# Altium footprint library microbuilder.PCBLIB: 422 footprints (part 20 of 27)
Each footprint in its own frame and in the unit in brackets; x right, y up, seen from the top. Pads: shape width x height; smd on the part's side, far side on the other; paste and mask are expansions set on the pad; w line width, h text height; cw(c..) or ccw(c..) is an arc to the next point about the centre after c.
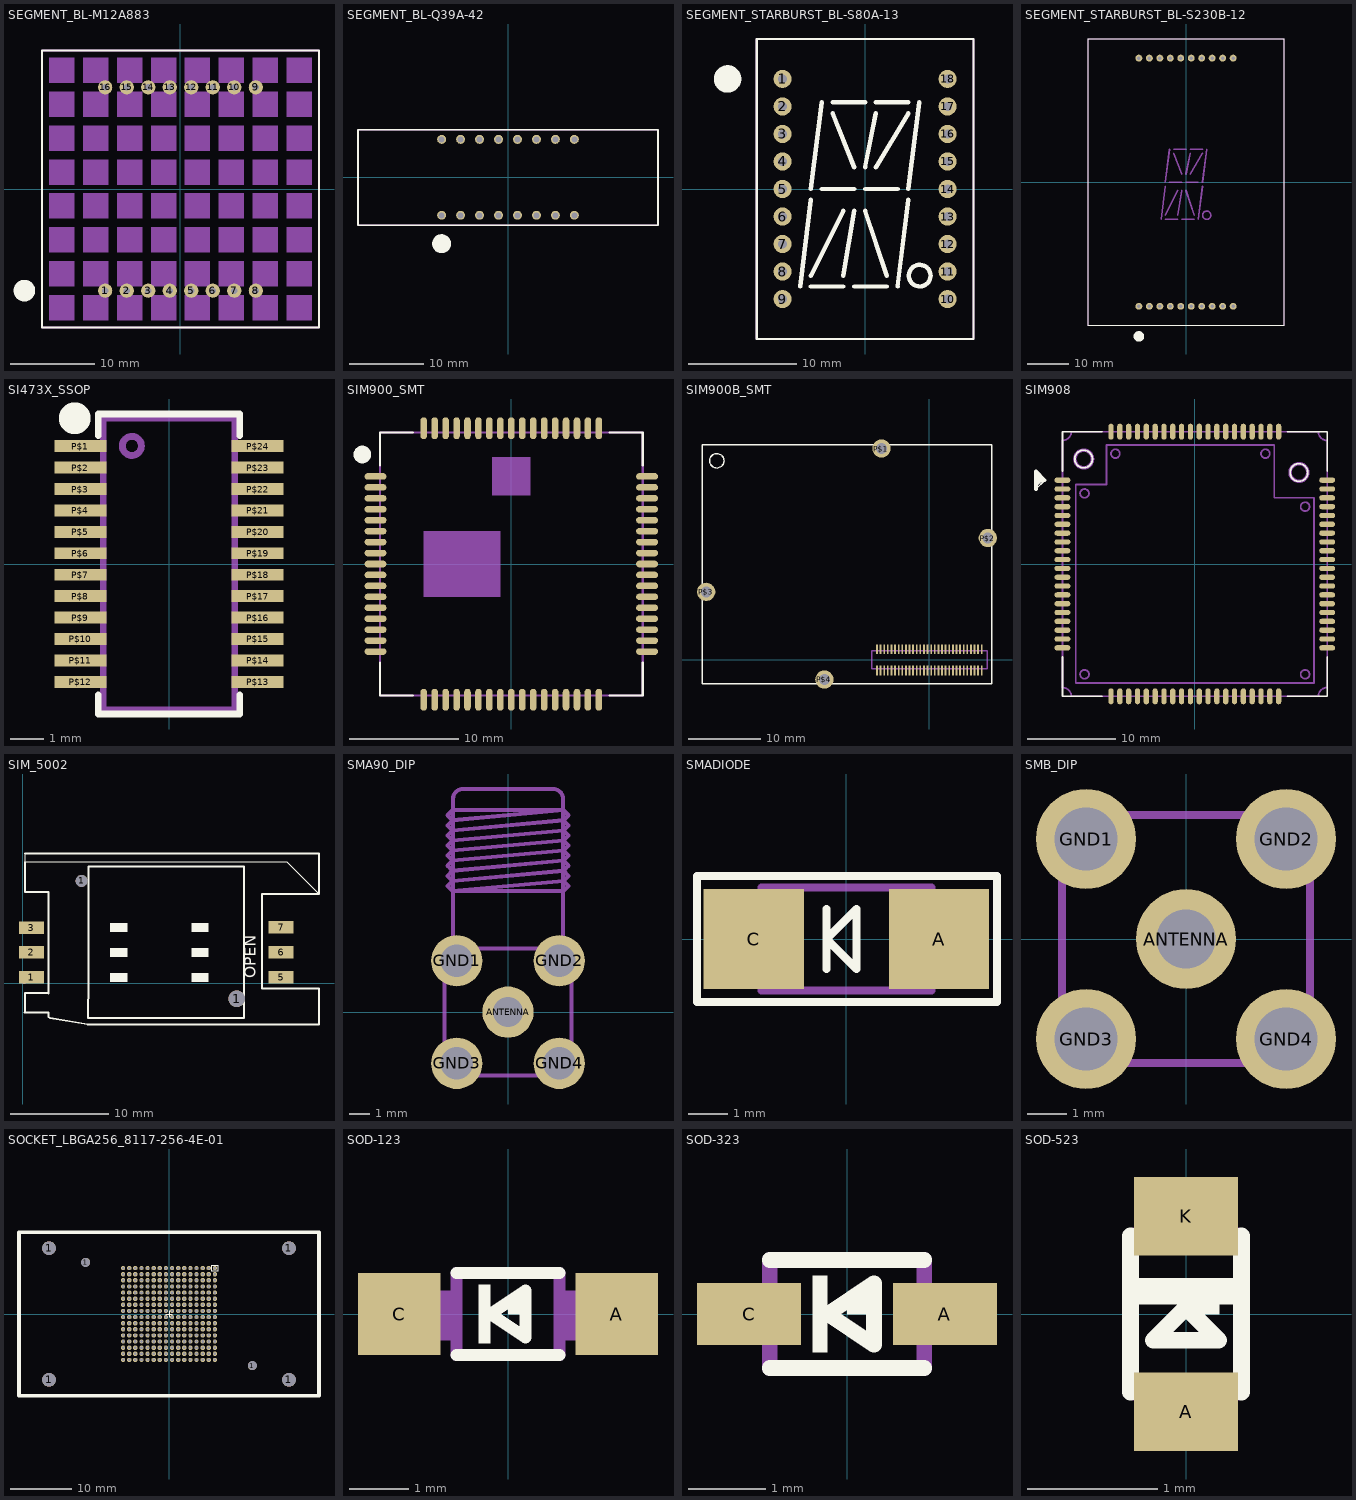
[diagram p19: the footprints below, top view; thin cyan lines are the x and y axes]

## SEGMENT_BL-M12A883 [mil]
pads (16):
  round 66 hole 31.5: 1(-350,-472.44) 2(-250,-472.44) 3(-150,-472.44) 4(-50,-472.44) 5(50,-472.44) 6(150,-472.44) 7(250,-472.44) 8(350,-472.44) 9(350,472.44) 10(250,472.44) 11(150,472.44) 12(50,472.44) 13(-50,472.44) 14(-150,472.44) 15(-250,472.44) 16(-350,472.44)
Top Overlay:
  circle w50: c-725.59,-472.44 r25
  lines w8: -643.7,-643.7 643.7,-643.7 643.7,643.7 -643.7,643.7 -643.7,-643.7
Mechanical 16:
  rectangle: -610.24,492.13 -492.13,610.24
  rectangle: -452.76,492.13 -334.65,610.24
  rectangle: -295.28,492.13 -177.17,610.24
  rectangle: -137.8,492.13 -19.69,610.24
  rectangle: 19.69,492.13 137.8,610.24
  rectangle: 177.17,492.13 295.28,610.24
  rectangle: 334.65,492.13 452.76,610.24
  rectangle: 492.13,492.13 610.24,610.24
  rectangle: 492.13,334.65 610.24,452.76
  rectangle: 334.65,334.65 452.76,452.76
  rectangle: 177.17,334.65 295.28,452.76
  rectangle: 19.69,334.65 137.8,452.76
  rectangle: -137.8,334.65 -19.69,452.76
  rectangle: -295.28,334.65 -177.17,452.76
  rectangle: -610.24,334.65 -492.13,452.76
  rectangle: -452.76,334.65 -334.65,452.76
  rectangle: -610.24,177.17 -492.13,295.28
  rectangle: -452.76,177.17 -334.65,295.28
  rectangle: -295.28,177.17 -177.17,295.28
  rectangle: -137.8,177.17 -19.69,295.28
  rectangle: 19.69,177.17 137.8,295.28
  rectangle: 177.17,177.17 295.28,295.28
  rectangle: 334.65,177.17 452.76,295.28
  rectangle: 492.13,177.17 610.24,295.28
  rectangle: 492.13,19.69 610.24,137.8
  rectangle: 492.13,-137.8 610.24,-19.69
  rectangle: 334.65,-137.8 452.76,-19.69
  rectangle: 334.65,19.69 452.76,137.8
  rectangle: 177.17,19.69 295.28,137.8
  rectangle: 19.69,19.69 137.8,137.8
  rectangle: -137.8,19.69 -19.69,137.8
  rectangle: -295.28,19.69 -177.17,137.8
  rectangle: -452.76,19.69 -334.65,137.8
  rectangle: -610.24,19.69 -492.13,137.8
  rectangle: -610.24,-137.8 -492.13,-19.69
  rectangle: -452.76,-137.8 -334.65,-19.69
  rectangle: -295.28,-137.8 -177.17,-19.69
  rectangle: -137.8,-137.8 -19.69,-19.69
  rectangle: 19.69,-137.8 137.8,-19.69
  rectangle: 177.17,-137.8 295.28,-19.69
  rectangle: 492.13,-295.28 610.24,-177.17
  rectangle: 334.65,-295.28 452.76,-177.17
  rectangle: -610.24,-295.28 -492.13,-177.17
  rectangle: -452.76,-295.28 -334.65,-177.17
  rectangle: -295.28,-295.28 -177.17,-177.17
  rectangle: -137.8,-295.28 -19.69,-177.17
  rectangle: 19.69,-295.28 137.8,-177.17
  rectangle: 177.17,-295.28 295.28,-177.17
  rectangle: 492.13,-452.76 610.24,-334.65
  rectangle: 334.65,-452.76 452.76,-334.65
  rectangle: -610.24,-452.76 -492.13,-334.65
  rectangle: -452.76,-452.76 -334.65,-334.65
  rectangle: -295.28,-452.76 -177.17,-334.65
  rectangle: -137.8,-452.76 -19.69,-334.65
  rectangle: 19.69,-452.76 137.8,-334.65
  rectangle: 177.17,-452.76 295.28,-334.65
  rectangle: 492.13,-610.24 610.24,-492.13
  rectangle: 334.65,-610.24 452.76,-492.13
  rectangle: -610.24,-610.24 -492.13,-492.13
  rectangle: -452.76,-610.24 -334.65,-492.13
  rectangle: -295.28,-610.24 -177.17,-492.13
  rectangle: -137.8,-610.24 -19.69,-492.13
  rectangle: 19.69,-610.24 137.8,-492.13
  rectangle: 177.17,-610.24 295.28,-492.13
  lines w8: -643.7,-643.7 643.7,-643.7 643.7,643.7 -643.7,643.7 -643.7,-643.7

## SEGMENT_BL-Q39A-42 [mil]
pads (16):
  round 47.25 hole 31.5: P$1(-350,-200) P$2(-250,-200) P$3(-150,-200) P$4(-50,-200) P$5(50,-200) P$6(150,-200) P$7(250,-200) P$8(350,-200) P$9(350,200) P$10(250,200) P$11(150,200) P$12(50,200) P$13(-50,200) P$14(-150,200) P$15(-250,200) P$16(-350,200)
Top Overlay:
  circle w50: c-350,-350 r25
  lines w8: -790.94,-251.97 790.94,-251.97 790.94,251.97 -790.94,251.97 -790.94,-251.97
Mechanical 16:
  lines w5: -790.94,-251.97 790.94,-251.97 790.94,251.97 -790.94,251.97 -790.94,-251.97

## SEGMENT_STARBURST_BL-S80A-13 [mil]
pads (18):
  round 66 hole 31.5: 1(-300,400) 2(-300,300) 3(-300,200) 4(-300,100) 5(-300,0) 6(-300,-100) 7(-300,-200) 8(-300,-300) 9(-300,-400) 10(300,-400) 11(300,-300) 12(300,-200) 13(300,-100) 14(300,0) 15(300,100) 16(300,200) 17(300,300) 18(300,400)
Top Overlay:
  circle w16: c198.72,-314.96 r39.37
  circle w50: c-500,400 r25
  lines w8: -393.7,-545.28 393.7,-545.28 393.7,545.28 -393.7,545.28 -393.7,-545.28
  lines w16: -236.22,-354.33 -196.85,-39.37 ; -196.85,-354.33 -78.74,-354.33 ; -196.85,-314.96 -78.74,-78.74 ; -196.85,0 -157.48,314.96 ; -157.48,0 -39.37,0 ; -118.11,275.59 -39.37,78.74 ; -118.11,314.96 0,314.96 ; -78.74,-314.96 -39.37,-78.74 ; -39.37,-354.33 78.74,-354.33 ; 0,-78.74 78.74,-314.96 ; 0,0 118.11,0 ; 0,78.74 39.37,275.59 ; 39.37,78.74 157.48,275.59 ; 39.37,314.96 157.48,314.96 ; 118.11,-354.33 157.48,-39.37 ; 157.48,0 196.85,314.96
Mechanical 16:
  lines w8: -393.7,-545.28 393.7,-545.28 393.7,545.28 -393.7,545.28 -393.7,-545.28
  text "A1" at -78.74,334.65 h62
  text "A2" at 78.74,334.65 h62
  text "D1" at -177.17,-413.39 h62
  text "D2" at -19.69,-413.39 h62
  text "E" at -275.59,-196.85 h62
  text "F" at -236.22,157.48 h62
  text "B" at 216.54,157.48 h62
  text "C" at 177.17,-196.85 h62
  text "G1" at -118.11,19.69 h62
  text "G2" at 39.37,19.69 h62
  text "L" at 39.37,-118.11 h62
  text "M" at -39.37,-236.22 h62
  text "N" at -137.8,-118.11 h62
  text "J" at -19.69,196.85 h62
  text "K" at 118.11,137.8 h62
  text "H" at -118.11,137.8 h62
  text "DP" at 166.54,-413.39 h62

## SEGMENT_STARBURST_BL-S230B-12 [mil]
pads (20):
  round 66 hole 31.5: 1(-450,-1185.04) 2(-350,-1185.04) 3(-250,-1185.04) 4(-150,-1185.04) 5(-50,-1185.04) 6(50,-1185.04) 7(150,-1185.04) 8(250,-1185.04) 9(350,-1185.04) 10(450,-1185.04) 11(450,1185.04) 12(350,1185.04) 13(250,1185.04) 14(150,1185.04) 15(50,1185.04) 16(-50,1185.04) 17(-150,1185.04) 18(-250,1185.04) 19(-350,1185.04) 20(-450,1185.04)
Top Overlay:
  circle w50: c-450,-1472.44 r25
  lines w8: -937.01,-1368.11 -937.01,1368.11 937.01,1368.11 937.01,-1368.11 -937.01,-1368.11
Mechanical 16:
  circle w16: c198.72,-314.96 r39.37
  lines w8: -937.01,-1368.11 -937.01,1368.11 937.01,1368.11 937.01,-1368.11 -937.01,-1368.11
  lines w16: -236.22,-354.33 -196.85,-39.37 ; -196.85,-354.33 -78.74,-354.33 ; -196.85,-314.96 -78.74,-78.74 ; -196.85,0 -157.48,314.96 ; -157.48,0 -39.37,0 ; -118.11,275.59 -39.37,78.74 ; -118.11,314.96 0,314.96 ; -78.74,-314.96 -39.37,-78.74 ; -39.37,-354.33 78.74,-354.33 ; 0,-78.74 78.74,-314.96 ; 0,0 118.11,0 ; 0,78.74 39.37,275.59 ; 39.37,78.74 157.48,275.59 ; 39.37,314.96 157.48,314.96 ; 118.11,-354.33 157.48,-39.37 ; 157.48,0 196.85,314.96
  text "A1" at -78.74,334.65 h62
  text "A2" at 78.74,334.65 h62
  text "D1" at -177.17,-413.39 h62
  text "D2" at -19.69,-413.39 h62
  text "F" at -236.22,157.48 h62
  text "B" at 216.54,157.48 h62
  text "C" at 177.17,-196.85 h62
  text "G1" at -118.11,19.69 h62
  text "G2" at 39.37,19.69 h62
  text "L" at 39.37,-118.11 h62
  text "M" at -39.37,-236.22 h62
  text "N" at -137.8,-118.11 h62
  text "J" at -19.69,196.85 h62
  text "K" at 118.11,137.8 h62
  text "H" at -118.11,137.8 h62
  text "DP" at 166.54,-413.39 h62

## SI473X_SSOP [mm]
pads (24):
  rect 1.55x0.35 smd: P$1(-2.625,3.492) P$2(-2.625,2.857) P$3(-2.625,2.222) P$4(-2.625,1.587) P$5(-2.625,0.953) P$6(-2.625,0.318) P$7(-2.625,-0.318) P$8(-2.625,-0.953) P$9(-2.625,-1.587) P$10(-2.625,-2.222) P$11(-2.625,-2.857) P$12(-2.625,-3.492) P$13(2.625,-3.492) P$14(2.625,-2.857) P$15(2.625,-2.222) P$16(2.625,-1.587) P$17(2.625,-0.953) P$18(2.625,-0.318) P$19(2.625,0.318) P$20(2.625,0.953) P$21(2.625,1.587) P$22(2.625,2.222) P$23(2.625,2.857) P$24(2.625,3.492)
Top Overlay:
  circle w0.813: c-2.794,4.318 r0.064
  lines w0.203: -2.095,-3.873 -2.095,-4.445 2.095,-4.445 2.095,-3.873 ; -2.095,3.81 -2.095,4.445 -2.032,4.445 2.095,4.445 2.095,3.81
Mechanical 16:
  circle w0.203: c-1.1,3.5 r0.283
  lines w0.203: -1.95,-4.325 1.95,-4.325 1.95,4.325 -1.95,4.325 -1.95,-4.325

## SIM900_SMT [mm]
pads (68):
  rrect100% 2x0.6 smd: P$1(-12.4,8) P$2(-12.4,7) P$3(-12.4,6) P$4(-12.4,5) P$5(-12.4,4) P$6(-12.4,3) P$7(-12.4,2) P$8(-12.4,1) P$9(-12.4,0) P$10(-12.4,-1) P$11(-12.4,-2) P$12(-12.4,-3) P$13(-12.4,-4) P$14(-12.4,-5) P$15(-12.4,-6) P$16(-12.4,-7) P$17(-12.4,-8) P$35(12.4,-8) P$36(12.4,-7) P$37(12.4,-6) P$38(12.4,-5) P$39(12.4,-4) P$40(12.4,-3) P$41(12.4,-2) P$42(12.4,-1) P$43(12.4,0) P$44(12.4,1) P$45(12.4,2) P$46(12.4,3) P$47(12.4,4) P$48(12.4,5) P$49(12.4,6) P$50(12.4,7) P$51(12.4,8)
  rrect100% 0.6x2 smd: P$18(-8,-12.4) P$19(-7,-12.4) P$20(-6,-12.4) P$21(-5,-12.4) P$22(-4,-12.4) P$23(-3,-12.4) P$24(-2,-12.4) P$25(-1,-12.4) P$26(0,-12.4) P$27(1,-12.4) P$28(2,-12.4) P$29(3,-12.4) P$30(4,-12.4) P$31(5,-12.4) P$32(6,-12.4) P$33(7,-12.4) P$34(8,-12.4) P$52(8,12.4) P$53(7,12.4) P$54(6,12.4) P$55(5,12.4) P$56(4,12.4) P$57(3,12.4) P$58(2,12.4) P$59(1,12.4) P$60(0,12.4) P$61(-1,12.4) P$62(-2,12.4) P$63(-3,12.4) P$64(-4,12.4) P$65(-5,12.4) P$66(-6,12.4) P$67(-7,12.4) P$68(-8,12.4)
Top Overlay:
  circle w0.813: c-13.6,10 r0.4
  lines w0.203: -12,-9 -12,-12 -9,-12 ; -12,9 -12,12 -9,12 ; 9,-12 12,-12 12,-9 ; 9,12 12,12 12,9
Mechanical 16:
  lines w0.203: -12,-12 -12,12 12,12 12,-12 -12,-12
Mechanical 27:
  rectangle: -8,-3 -1,3
  rectangle: -1.75,6.25 1.75,9.75

## SIM900B_SMT [mm]
pads (64):
  rect 0.25x1.35 smd: 1(-7.25,-1.475) 2(-7.25,1.475) 3(-6.75,-1.475) 4(-6.75,1.475) 5(-6.25,-1.475) 6(-6.25,1.475) 7(-5.75,-1.475) 8(-5.75,1.475) 9(-5.25,-1.475) 10(-5.25,1.475) 11(-4.75,-1.475) 12(-4.75,1.475) 13(-4.25,-1.475) 14(-4.25,1.475) 15(-3.75,-1.475) 16(-3.75,1.475) 17(-3.25,-1.475) 18(-3.25,1.475) 19(-2.75,-1.475) 20(-2.75,1.475) 21(-2.25,-1.475) 22(-2.25,1.475) 23(-1.75,-1.475) 24(-1.75,1.475) 25(-1.25,-1.475) 26(-1.25,1.475) 27(-0.75,-1.475) 28(-0.75,1.475) 29(-0.25,-1.475) 30(-0.25,1.475) 31(0.25,-1.475) 32(0.25,1.475) 33(0.75,-1.475) 34(0.75,1.475) 35(1.25,-1.475) 36(1.25,1.475) 37(1.75,-1.475) 38(1.75,1.475) 39(2.25,-1.475) 40(2.25,1.475) 41(2.75,-1.475) 42(2.75,1.475) 43(3.25,-1.475) 44(3.25,1.475) 45(3.75,-1.475) 46(3.75,1.475) 47(4.25,-1.475) 48(4.25,1.475) 49(4.75,-1.475) 50(4.75,1.475) 51(5.25,-1.475) 52(5.25,1.475) 53(5.75,-1.475) 54(5.75,1.475) 55(6.25,-1.475) 56(6.25,1.475) 57(6.75,-1.475) 58(6.75,1.475) 59(7.25,-1.475) 60(7.25,1.475)
  round 2.54 hole 1.5: P$1(-6.63,29.25) P$2(8.09,16.86) P$3(-30.89,9.41) P$4(-14.53,-2.72)
Top Overlay:
  circle w0.203: c-29.42,27.55 r1
  lines w0.203: -31.45,-3.34 8.65,-3.34 8.65,29.76 -31.45,29.76 -31.45,-3.34
Mechanical 16:
  lines w0.203: -8,-1.25 8,-1.25 8,1.25 -8,1.25 -8,-1.25

## SIM908 [mm]
pads (80):
  rrect100% 1.8x0.6 smd: P$1(-15,9.5) P$2(-15,8.5) P$3(-15,7.5) P$4(-15,6.5) P$5(-15,5.5) P$6(-15,4.5) P$7(-15,3.5) P$8(-15,2.5) P$9(-15,1.5) P$10(-15,0.5) P$11(-15,-0.5) P$12(-15,-1.5) P$13(-15,-2.5) P$14(-15,-3.5) P$15(-15,-4.5) P$16(-15,-5.5) P$17(-15,-6.5) P$18(-15,-7.5) P$19(-15,-8.5) P$20(-15,-9.5) P$41(15,-9.5) P$42(15,-8.5) P$43(15,-7.5) P$44(15,-6.5) P$45(15,-5.5) P$46(15,-4.5) P$47(15,-3.5) P$48(15,-2.5) P$49(15,-1.5) P$50(15,-0.5) P$51(15,0.5) P$52(15,1.5) P$53(15,2.5) P$54(15,3.5) P$55(15,4.5) P$56(15,5.5) P$57(15,6.5) P$58(15,7.5) P$59(15,8.5) P$60(15,9.5)
  rrect100% 0.6x1.8 smd: P$21(-9.5,-15) P$22(-8.5,-15) P$23(-7.5,-15) P$24(-6.5,-15) P$25(-5.5,-15) P$26(-4.5,-15) P$27(-3.5,-15) P$28(-2.5,-15) P$29(-1.5,-15) P$30(-0.5,-15) P$31(0.5,-15) P$32(1.5,-15) P$33(2.5,-15) P$34(3.5,-15) P$35(4.5,-15) P$36(5.5,-15) P$37(6.5,-15) P$38(7.5,-15) P$39(8.5,-15) P$40(9.5,-15) P$61(9.5,15) P$62(8.5,15) P$63(7.5,15) P$64(6.5,15) P$65(5.5,15) P$66(4.5,15) P$67(3.5,15) P$68(2.5,15) P$69(1.5,15) P$70(0.5,15) P$71(-0.5,15) P$72(-1.5,15) P$73(-2.5,15) P$74(-3.5,15) P$75(-4.5,15) P$76(-5.5,15) P$77(-6.5,15) P$78(-7.5,15) P$79(-8.5,15) P$80(-9.5,15)
Top Overlay:
  circle w0.203: c-12.6,11.9 r1
  circle w0.203: c11.8,10.37 r1
  lines w0.203: -18,8.5 -17,9.5 ; -15,-10.5 -15,-15 -10.5,-15 ; -15,10.5 -15,15 -10.5,15 ; 10.5,-15 15,-15 15,-10.5 ; 10.5,15 15,15 15,10.5
  lines w0.406: -18,8.5 -18,9 ; -18,9 -17.5,9.5 ; -18,9 -18,10 ; -18,10 -18,10.5 -17,9.5 -17.5,9.5 ; -18,10 -17.5,9.5
Mechanical 16:
  circle w0.203: c-12.5,8 r0.5
  circle w0.203: c-9,12.5 r0.5
  circle w0.203: c8,12.5 r0.5
  circle w0.203: c12.5,6.5 r0.5
  circle w0.203: c-12.5,-12.5 r0.5
  circle w0.203: c12.5,-12.5 r0.5
  circle w0.406: c-12.6,11.9 r1
  circle w0.406: c11.8,10.37 r1
  lines w0.203: -15,-14 -15,14 ccw(c-15,15) -14,15 14,15 ccw(c15,15) 15,14 15,-14 ccw(c15,-15) 14,-15 -14,-15 ccw(c-15,-15) -15,-14 ; -13.5,-13.5 13.5,-13.5 13.5,7.5 9,7.5 9,13.5 -10,13.5 -10,9 -13.5,9 -13.5,-13.5

## SIM_5002 [mm]
pads (8):
  rect 2.54x1.27 smd: 1(0.904,0.574) 2(0.904,3.114) 3(0.904,5.654) 5(26.299,0.594) 6(26.299,3.134) 7(26.299,5.674)
  round 1.2 hole 1.2: 1(6,10.4)
  round 1.7 hole 1.7: 1(21.8,-1.6)
Top Overlay:
  rectangle: 8.914,0.114 10.684,1.014
  rectangle: 8.914,2.654 10.684,3.554
  rectangle: 8.914,5.194 10.684,6.094
  rectangle: 17.169,0.114 18.939,1.014
  rectangle: 17.169,2.654 18.939,3.554
  rectangle: 17.169,5.194 18.939,6.094
  region: 0,0 0.254,0 0.254,0.254 0,0.254
  region: 0,0 0.254,0 0.254,0.254 0,0.254
  region: 0,0 0.254,0 0.254,0.254 0,0.254
  lines w0.127: 0.254,13.164 0.254,12.319 26.924,12.319 30.099,9.144
  lines w0.203: 0.208,-2.996 2.614,-2.989 2.614,-3.459 ; 0.254,-2.921 0.254,-1.016 2.657,-1.016 ; 0.254,12.319 0.254,9.264 2.654,9.264 ; 0.254,13.164 1.614,13.164 ; 1.597,13.162 26.015,13.165 30.149,13.175 ; 2.655,9.258 2.656,0.319 2.657,-1.016 ; 2.657,-1.044 2.657,-1.016 ; 2.794,-3.556 6.604,-4.191 30.161,-4.191 ; 24.359,0.239 24.359,9.084 30.164,9.084 ; 24.364,0.343 24.364,-0.536 30.164,-0.536 30.162,-4.205 ; 30.154,9.084 30.154,13.174 ; 6.659,-3.537 6.684,0.274 6.684,11.879 22.524,11.879 22.524,-3.556 6.659,-3.537
  text "OPEN" at 24.109,0.479 h1.97

## SMA90_DIP [mm]
pads (5):
  round 2.54 hole 1.5: ANTENNA(0,0)
  round 2.54 hole 1.6: GND1(-2.54,2.54) GND2(2.54,2.54) GND3(-2.54,-2.54) GND4(2.54,-2.54)
Mechanical 16:
  lines w0.203: -2.725,3.15 -2.725,10.55 ; -2.72,10.565 cw(c-2.235,10.565) -2.235,11.05 ; -2.225,11.05 2.225,11.05 ; 2.24,11.05 cw(c2.24,10.565) 2.725,10.565 ; 2.725,3.15 2.725,10.55 ; -2.75,6 -3,6.25 -2.75,6.5 ; -2.75,6 2.75,6.5 ; -2.75,6 2.75,6 3,6.25 2.75,6.5 ; -2.75,6.5 -3,6.75 -2.75,7 ; -2.75,6.5 2.75,7 ; -2.75,7 -3,7.25 -2.75,7.5 ; -2.75,7 2.75,7.5 ; -2.75,7.5 -3,7.75 -2.75,8 ; -2.75,7.5 2.75,8 ; -2.75,8 -3,8.25 -2.75,8.5 ; -2.75,8 2.75,8.5 ; -2.75,8.5 -3,8.75 -2.75,9 ; -2.75,8.5 2.75,9 ; -2.75,9 -3,9.25 -2.75,9.5 ; -2.75,9 2.75,9.5 ; -2.75,9.5 -3,9.75 -2.75,10 2.75,10 ; -2.75,9.5 2.75,10 ; 2.75,6.5 3,6.75 2.75,7 ; 2.75,7 3,7.25 2.75,7.5 ; 2.75,7.5 3,7.75 2.75,8 ; 2.75,8 3,8.25 2.75,8.5 ; 2.75,8.5 3,8.75 2.75,9 ; 2.75,9 3,9.25 2.75,9.5 ; 2.75,9.5 3,9.75 2.75,10 ; -3.15,-2.52 ccw(c-2.52,-2.52) -2.52,-3.15 2.52,-3.15 ccw(c2.52,-2.52) 3.15,-2.52 3.15,2.52 ccw(c2.52,2.52) 2.52,3.15 -2.52,3.15 ccw(c-2.52,2.52) -3.15,2.52 -3.15,-2.52

## SMADIODE [mil]
pads (2):
  rect 100x100 smd: A(92.5,0) C(-92.5,0)
Top Overlay:
  lines w5: -149.17,-54.88 -149.17,-45.12 ; 150.24,52.62 150.24,54.88
  lines w8: -20,-30 -20,0 ; -20,30 -20,0 ; -20,0 10,-30 10,30 -20,0 ; -149.17,-62.99 150.24,-62.99 150.24,54.88 150.24,62.99 -149.17,62.99 -149.17,-45.12 -149.17,-62.99
Mechanical 16:
  rectangle: -111.22,-43.31 -85.63,43.31
  region: 111.22,43.31 85.63,43.31 85.63,-43.31 111.22,-43.31
  rectangle: -68.9,-48.23 -42.32,48.23
  lines w8: -84.65,-51.18 84.65,-51.18 84.65,51.18 -84.65,51.18 -84.65,-51.18

## SMB_DIP [mm]
pads (5):
  round 2.54 hole 1.5: ANTENNA(0,0)
  round 2.54 hole 1.6: GND1(-2.54,2.54) GND2(2.54,2.54) GND3(-2.54,-2.54) GND4(2.54,-2.54)
Mechanical 16:
  lines w0.203: -3.15,-2.52 ccw(c-2.52,-2.52) -2.52,-3.15 2.52,-3.15 ccw(c2.52,-2.52) 3.15,-2.52 3.15,2.52 ccw(c2.52,2.52) 2.52,3.15 -2.52,3.15 ccw(c-2.52,2.52) -3.15,2.52 -3.15,-2.52

## SOCKET_LBGA256_8117-256-4E-01 [mm]
pads (262):
  round 2.26 hole 2.26: 1(-19.6,-10.75) 1(-19.6,10.75) 1(19.6,-10.75) 1(19.6,10.75)
  round 1.47 hole 1.47: 1(-13.6,8.45) 1(13.6,-8.45)
  oct 0.7x0.7 hole 0.43: A1(7.5,7.5) A2(7.5,6.5) A3(7.5,5.5) A4(7.5,4.5) A5(7.5,3.5) A6(7.5,2.5) A7(7.5,1.5) A8(7.5,0.5) A9(7.5,-0.5) A10(7.5,-1.5) A11(7.5,-2.5) A12(7.5,-3.5) A13(7.5,-4.5) A14(7.5,-5.5) A15(7.5,-6.5) A16(7.5,-7.5) B1(6.5,7.5) B2(6.5,6.5) B3(6.5,5.5) B4(6.5,4.5) B5(6.5,3.5) B6(6.5,2.5) B7(6.5,1.5) B8(6.5,0.5) B9(6.5,-0.5) B10(6.5,-1.5) B11(6.5,-2.5) B12(6.5,-3.5) B13(6.5,-4.5) B14(6.5,-5.5) B15(6.5,-6.5) B16(6.5,-7.5) C1(5.5,7.5) C2(5.5,6.5) C3(5.5,5.5) C4(5.5,4.5) C5(5.5,3.5) C6(5.5,2.5) C7(5.5,1.5) C8(5.5,0.5) C9(5.5,-0.5) C10(5.5,-1.5) C11(5.5,-2.5) C12(5.5,-3.5) C13(5.5,-4.5) C14(5.5,-5.5) C15(5.5,-6.5) C16(5.5,-7.5) D1(4.5,7.5) D2(4.5,6.5) D3(4.5,5.5) D4(4.5,4.5) D5(4.5,3.5) D6(4.5,2.5) D7(4.5,1.5) D8(4.5,0.5) D9(4.5,-0.5) D10(4.5,-1.5) D11(4.5,-2.5) D12(4.5,-3.5) D13(4.5,-4.5) D14(4.5,-5.5) D15(4.5,-6.5) D16(4.5,-7.5) E1(3.5,7.5) E2(3.5,6.5) E3(3.5,5.5) E4(3.5,4.5) E5(3.5,3.5) E6(3.5,2.5) E7(3.5,1.5) E8(3.5,0.5) E9(3.5,-0.5) E10(3.5,-1.5) E11(3.5,-2.5) E12(3.5,-3.5) E13(3.5,-4.5) E14(3.5,-5.5) E15(3.5,-6.5) E16(3.5,-7.5) F1(2.5,7.5) F2(2.5,6.5) F3(2.5,5.5) F4(2.5,4.5) F5(2.5,3.5) F6(2.5,2.5) F7(2.5,1.5) F8(2.5,0.5) F9(2.5,-0.5) F10(2.5,-1.5) F11(2.5,-2.5) F12(2.5,-3.5) F13(2.5,-4.5) F14(2.5,-5.5) F15(2.5,-6.5) F16(2.5,-7.5) G1(1.5,7.5) G2(1.5,6.5) G3(1.5,5.5) G4(1.5,4.5) G5(1.5,3.5) G6(1.5,2.5) G7(1.5,1.5) G8(1.5,0.5) G9(1.5,-0.5) G10(1.5,-1.5) G11(1.5,-2.5) G12(1.5,-3.5) G13(1.5,-4.5) G14(1.5,-5.5) G15(1.5,-6.5) G16(1.5,-7.5) H1(0.5,7.5) H2(0.5,6.5) H3(0.5,5.5) H4(0.5,4.5) H5(0.5,3.5) H6(0.5,2.5) H7(0.5,1.5) H8(0.5,0.5) H9(0.5,-0.5) H10(0.5,-1.5) H11(0.5,-2.5) H12(0.5,-3.5) H13(0.5,-4.5) H14(0.5,-5.5) H15(0.5,-6.5) H16(0.5,-7.5) J1(-0.5,7.5) J2(-0.5,6.5) J3(-0.5,5.5) J4(-0.5,4.5) J5(-0.5,3.5) J6(-0.5,2.5) J7(-0.5,1.5) J8(-0.5,0.5) J9(-0.5,-0.5) J10(-0.5,-1.5) J11(-0.5,-2.5) J12(-0.5,-3.5) J13(-0.5,-4.5) J14(-0.5,-5.5) J15(-0.5,-6.5) J16(-0.5,-7.5) K1(-1.5,7.5) K2(-1.5,6.5) K3(-1.5,5.5) K4(-1.5,4.5) K5(-1.5,3.5) K6(-1.5,2.5) K7(-1.5,1.5) K8(-1.5,0.5) K9(-1.5,-0.5) K10(-1.5,-1.5) K11(-1.5,-2.5) K12(-1.5,-3.5) K13(-1.5,-4.5) K14(-1.5,-5.5) K15(-1.5,-6.5) K16(-1.5,-7.5) L1(-2.5,7.5) L2(-2.5,6.5) L3(-2.5,5.5) L4(-2.5,4.5) L5(-2.5,3.5) L6(-2.5,2.5) L7(-2.5,1.5) L8(-2.5,0.5) L9(-2.5,-0.5) L10(-2.5,-1.5) L11(-2.5,-2.5) L12(-2.5,-3.5) L13(-2.5,-4.5) L14(-2.5,-5.5) L15(-2.5,-6.5) L16(-2.5,-7.5) M1(-3.5,7.5) M2(-3.5,6.5) M3(-3.5,5.5) M4(-3.5,4.5) M5(-3.5,3.5) M6(-3.5,2.5) M7(-3.5,1.5) M8(-3.5,0.5) M9(-3.5,-0.5) M10(-3.5,-1.5) M11(-3.5,-2.5) M12(-3.5,-3.5) M13(-3.5,-4.5) M14(-3.5,-5.5) M15(-3.5,-6.5) M16(-3.5,-7.5) N1(-4.5,7.5) N2(-4.5,6.5) N3(-4.5,5.5) N4(-4.5,4.5) N5(-4.5,3.5) N6(-4.5,2.5) N7(-4.5,1.5) N8(-4.5,0.5) N9(-4.5,-0.5) N10(-4.5,-1.5) N11(-4.5,-2.5) N12(-4.5,-3.5) N13(-4.5,-4.5) N14(-4.5,-5.5) N15(-4.5,-6.5) N16(-4.5,-7.5) P1(-5.5,7.5) P2(-5.5,6.5) P3(-5.5,5.5) P4(-5.5,4.5) P5(-5.5,3.5) P6(-5.5,2.5) P7(-5.5,1.5) P8(-5.5,0.5) P9(-5.5,-0.5) P10(-5.5,-1.5) P11(-5.5,-2.5) P12(-5.5,-3.5) P13(-5.5,-4.5) P14(-5.5,-5.5) P15(-5.5,-6.5) P16(-5.5,-7.5) R1(-6.5,7.5) R2(-6.5,6.5) R3(-6.5,5.5) R4(-6.5,4.5) R5(-6.5,3.5) R6(-6.5,2.5) R7(-6.5,1.5) R8(-6.5,0.5) R9(-6.5,-0.5) R10(-6.5,-1.5) R11(-6.5,-2.5) R12(-6.5,-3.5) R13(-6.5,-4.5) R14(-6.5,-5.5) R15(-6.5,-6.5) R16(-6.5,-7.5) T1(-7.5,7.5) T2(-7.5,6.5) T3(-7.5,5.5) T4(-7.5,4.5) T5(-7.5,3.5) T6(-7.5,2.5) T7(-7.5,1.5) T8(-7.5,0.5) T9(-7.5,-0.5) T10(-7.5,-1.5) T11(-7.5,-2.5) T12(-7.5,-3.5) T13(-7.5,-4.5) T14(-7.5,-5.5) T15(-7.5,-6.5) T16(-7.5,-7.5)
Top Overlay:
  lines w0.05: -0.5,0 0.5,0 ; 0,-0.5 0,0.5 ; 7,7 8,7 8,8 7,8 7,7
  lines w0.61: -24.5,-13.35 -24.5,13.35 24.5,13.35 24.5,-13.35 -24.5,-13.35
Bottom Overlay:
  lines w0.254: -7.5,-10 -7.5,-8 ; -6.5,-8.5 -6.5,-8 ; -5.5,-10 -5.5,-8 ; -4.5,-8.5 -4.5,-8 ; -3.5,-10 -3.5,-8 ; -2.5,-8.5 -2.5,-8 ; -1.5,-10 -1.5,-8 ; -0.5,-8.5 -0.5,-8 ; 0.5,-10 0.5,-8 ; 1.5,-8.5 1.5,-8 ; 2.5,-10 2.5,-8 ; 3.5,-8.5 3.5,-8 ; 4.5,-10 4.5,-8 ; 5.5,-8.5 5.5,-8 ; 6.5,-10 6.5,-8 ; 7.5,-8.5 7.5,-8 ; 8,-7.5 10,-7.5 ; 8,-6.5 8.5,-6.5 ; 8,-5.5 10,-5.5 ; 8,-4.5 8.5,-4.5 ; 8,-3.5 10,-3.5 ; 8,-2.5 8.5,-2.5 ; 8,-1.5 10,-1.5 ; 8,-0.5 8.5,-0.5 ; 8,0.5 10,0.5 ; 8,1.5 8.5,1.5 ; 8,2.5 10,2.5 ; 8,3.5 8.5,3.5 ; 8,4.5 10,4.5 ; 8,5.5 8.5,5.5 ; 8,6.5 10,6.5 ; 8,7.5 8.5,7.5
  text "A" at 8,-10 h1.57
  text "B" at 7,-11.5 h1.57
  text "C" at 6,-10 h1.57
  text "D" at 5,-11.5 h1.57
  text "E" at 4,-10 h1.57
  text "F" at 3,-11.5 h1.57
  text "G" at 2,-10 h1.57
  text "H" at 1,-11.5 h1.57
  text "J" at 0,-10 h1.57
  text "K" at -1,-11.5 h1.57
  text "L" at -2,-10 h1.57
  text "M" at -3,-11.5 h1.57
  text "N" at -4,-10 h1.57
  text "P" at -5,-11.5 h1.57
  text "R" at -6,-10 h1.57
  text "T" at -7,-11.5 h1.57
  text "16" at 12,-8 h1.57
  text "15" at 10.5,-7 h1.57
  text "14" at 12,-6 h1.57
  text "13" at 10.5,-5 h1.57
  text "12" at 12,-4 h1.57
  text "11" at 10.5,-3 h1.57
  text "10" at 12,-2 h1.57
  text "9" at 9.5,-1 h1.57
  text "8" at 11,0 h1.57
  text "7" at 9.5,1 h1.57
  text "6" at 11,2 h1.57
  text "5" at 9.5,3 h1.57
  text "4" at 11,4 h1.57
  text "3" at 9.5,5 h1.57
  text "2" at 11,6 h1.57
  text "1" at 9.5,7 h1.57

## SOD-123 [mm]
pads (2):
  rect 1.4x1.4 smd: A(1.85,0) C(-1.85,0)
Top Overlay:
  rectangle: -0.5,-0.5 -0.3,0.5
  region: 0,0 0.254,0 0.254,0.254 0,0.254
  lines w0.203: -0.873,-0.7 0.873,-0.7 ; -0.873,0.7 0.873,0.7 ; -0.3,0 0.3,0.4 0.3,-0.4 -0.3,0
Mechanical 16:
  rectangle: -1.723,-0.45 -0.973,0.4
  rectangle: 0.973,-0.45 1.723,0.4
  lines w0.203: -0.873,-0.7 -0.873,0.7 ; 0.873,-0.7 0.873,0.7

## SOD-323 [mm]
pads (2):
  rect 1.35x0.8 smd: A(1.27,0) C(-1.27,0)
Top Overlay:
  rectangle: -0.45,-0.5 -0.25,0.5
  region: 0,0 0.254,0 0.254,0.254 0,0.254
  lines w0.203: -1,-0.7 1,-0.7 ; -1,0.7 1,0.7 ; -0.25,0 0.35,0.4 0.35,-0.4 -0.25,0
Mechanical 16:
  lines w0.203: -1,-0.7 -1,0.7 ; 1,-0.7 1,0.7

## SOD-523 [mil]
pads (2):
  rect 31.5x23.62 smd: A(0,-29.53) K(0,29.53)
Top Overlay:
  region: -15.75,10.82 -15.75,2.94 15.75,2.93 15.75,10.81
  region: 0,0 10,0 10,10 0,10
  lines w5: -16.75,-23.62 -16.75,23.62 ; 16.75,-23.62 16.75,23.62 ; -9.84,-7.87 9.84,-7.87 0,1.97 -9.84,-7.87
Mechanical 16:
  region: -7.87,29.53 -7.87,21.65 7.87,21.65 7.87,29.53
  region: -7.87,-21.65 -7.87,-29.53 7.87,-29.53 7.87,-21.65
  lines w5: -15.75,-23.62 15.75,-23.62 ; -15.75,23.62 15.75,23.62